# Altium schematic symbol library jlcpcb_2025_04_resistors_extended_0201.schlib: 1508 symbols (part 4 of 8) (continued)
## RC0201FR-072K1L (continued)

## RC0201FR-072K2L
designator R?  Resistance: 2.2kΩ  (hidden comment: *)
Resistor, 2.2kΩ, ±1%, 50mW, 25V, ±200ppm/℃, -55℃~+125℃, SMD 0201; Manufacturer: Uniroyal; Manufacturer Part Number: RC0201FR-072K2L; Supplier 1: LCSC; Supplier Part Number 1: C142018; JLCPCB Part Number: C142018; Power Rating: 50mW; Category: Resistors; Package Size: 0201; JLCPCB Basic Part: Yes; Tolerance: ±1%; Voltage Rating: 25V; Temperature Coefficient: ±200ppm/℃; Temperature Rating: -55℃~+125℃; ComponentLink1Description: Datasheet; ComponentLink1URL: https://wmsc.lcsc.com/wmsc/upload/file/pdf/v2/lcsc/2304140030_YAGEO-RC0201FR-072K2L_C142018.pdf; ComponentLink2Description: JLCPCB Part URL; ComponentLink2URL: https://jlcpcb.com/partdetail/C142018
pins: 1, 2
1 alternate drawing of the same symbol

## RC0201FR-072K05L
designator R?  Resistance: 2.05kΩ  (hidden comment: *)
Resistor, 2.05kΩ, ±1%, 50mW, 25V, ±200ppm/℃, -55℃~+125℃, SMD 0201; Manufacturer: Uniroyal; Manufacturer Part Number: RC0201FR-072K05L; Supplier 1: LCSC; Supplier Part Number 1: C474569; JLCPCB Part Number: C474569; Power Rating: 50mW; Category: Resistors; Package Size: 0201; JLCPCB Basic Part: Yes; Tolerance: ±1%; Voltage Rating: 25V; Temperature Coefficient: ±200ppm/℃; Temperature Rating: -55℃~+125℃; ComponentLink1Description: Datasheet; ComponentLink1URL: https://wmsc.lcsc.com/wmsc/upload/file/pdf/v2/lcsc/2311211101_YAGEO-RC0201FR-072K05L_C474569.pdf; ComponentLink2Description: JLCPCB Part URL; ComponentLink2URL: https://jlcpcb.com/partdetail/C474569
pins: 1, 2
1 alternate drawing of the same symbol

## RC0201FR-072K7L
designator R?  Resistance: 2.7kΩ  (hidden comment: *)
Resistor, 2.7kΩ, ±1%, 50mW, 25V, ±200ppm/℃, -55℃~+125℃, SMD 0201; Manufacturer: Uniroyal; Manufacturer Part Number: RC0201FR-072K7L; Supplier 1: LCSC; Supplier Part Number 1: C273271; JLCPCB Part Number: C273271; Power Rating: 50mW; Category: Resistors; Package Size: 0201; JLCPCB Basic Part: Yes; Tolerance: ±1%; Voltage Rating: 25V; Temperature Coefficient: ±200ppm/℃; Temperature Rating: -55℃~+125℃; ComponentLink1Description: Datasheet; ComponentLink1URL: https://wmsc.lcsc.com/wmsc/upload/file/pdf/v2/lcsc/2112231430_YAGEO-RC0201FR-072K7L_C273271.pdf; ComponentLink2Description: JLCPCB Part URL; ComponentLink2URL: https://jlcpcb.com/partdetail/C273271
pins: 1, 2
1 alternate drawing of the same symbol

## RC0201FR-072K21L
designator R?  Resistance: 2.21kΩ  (hidden comment: *)
Resistor, 2.21kΩ, ±1%, 50mW, 25V, ±200ppm/℃, -55℃~+125℃, SMD 0201; Manufacturer: Uniroyal; Manufacturer Part Number: RC0201FR-072K21L; Supplier 1: LCSC; Supplier Part Number 1: C273270; JLCPCB Part Number: C273270; Power Rating: 50mW; Category: Resistors; Package Size: 0201; JLCPCB Basic Part: Yes; Tolerance: ±1%; Voltage Rating: 25V; Temperature Coefficient: ±200ppm/℃; Temperature Rating: -55℃~+125℃; ComponentLink1Description: Datasheet; ComponentLink1URL: https://wmsc.lcsc.com/wmsc/upload/file/pdf/v2/lcsc/2202281730_YAGEO-RC0201FR-072K21L_C273270.pdf; ComponentLink2Description: JLCPCB Part URL; ComponentLink2URL: https://jlcpcb.com/partdetail/C273270
pins: 1, 2
1 alternate drawing of the same symbol

## RC0201FR-072K43L
designator R?  Resistance: 2.43kΩ  (hidden comment: *)
Resistor, 2.43kΩ, ±1%, 50mW, 25V, ±200ppm/℃, -55℃~+125℃, SMD 0201; Manufacturer: Uniroyal; Manufacturer Part Number: RC0201FR-072K43L; Supplier 1: LCSC; Supplier Part Number 1: C474578; JLCPCB Part Number: C474578; Power Rating: 50mW; Category: Resistors; Package Size: 0201; JLCPCB Basic Part: Yes; Tolerance: ±1%; Voltage Rating: 25V; Temperature Coefficient: ±200ppm/℃; Temperature Rating: -55℃~+125℃; ComponentLink1Description: Datasheet; ComponentLink1URL: https://wmsc.lcsc.com/wmsc/upload/file/pdf/v2/lcsc/2311211101_YAGEO-RC0201FR-072K43L_C474578.pdf; ComponentLink2Description: JLCPCB Part URL; ComponentLink2URL: https://jlcpcb.com/partdetail/C474578
pins: 1, 2
1 alternate drawing of the same symbol

## RC0201FR-072K49L
designator R?  Resistance: 2.49kΩ  (hidden comment: *)
Resistor, 2.49kΩ, ±1%, 50mW, 15V, ±200ppm/℃, -55℃~+125℃, SMD 0201; Manufacturer: Uniroyal; Manufacturer Part Number: RC0201FR-072K49L; Supplier 1: LCSC; Supplier Part Number 1: C273272; JLCPCB Part Number: C273272; Power Rating: 50mW; Category: Resistors; Package Size: 0201; JLCPCB Basic Part: Yes; Tolerance: ±1%; Voltage Rating: 15V; Temperature Coefficient: ±200ppm/℃; Temperature Rating: -55℃~+125℃; ComponentLink1Description: Datasheet; ComponentLink1URL: https://wmsc.lcsc.com/wmsc/upload/file/pdf/v2/lcsc/2201051730_YAGEO-RC0201FR-072K49L_C273272.pdf; ComponentLink2Description: JLCPCB Part URL; ComponentLink2URL: https://jlcpcb.com/partdetail/C273272
pins: 1, 2
1 alternate drawing of the same symbol

## RC0201FR-072K67L
designator R?  Resistance: 2.67kΩ  (hidden comment: *)
Resistor, 2.67kΩ, ±1%, 50mW, ±200ppm/℃, -55℃~+125℃, SMD 0201; Manufacturer: Uniroyal; Manufacturer Part Number: RC0201FR-072K67L; Supplier 1: LCSC; Supplier Part Number 1: C474588; JLCPCB Part Number: C474588; Power Rating: 50mW; Category: Resistors; Package Size: 0201; JLCPCB Basic Part: Yes; Tolerance: ±1%; Temperature Coefficient: ±200ppm/℃; Temperature Rating: -55℃~+125℃; ComponentLink1Description: Datasheet; ComponentLink1URL: https://wmsc.lcsc.com/wmsc/upload/file/pdf/v2/lcsc/2311211101_YAGEO-RC0201FR-072K67L_C474588.pdf; ComponentLink2Description: JLCPCB Part URL; ComponentLink2URL: https://jlcpcb.com/partdetail/C474588
pins: 1, 2
1 alternate drawing of the same symbol

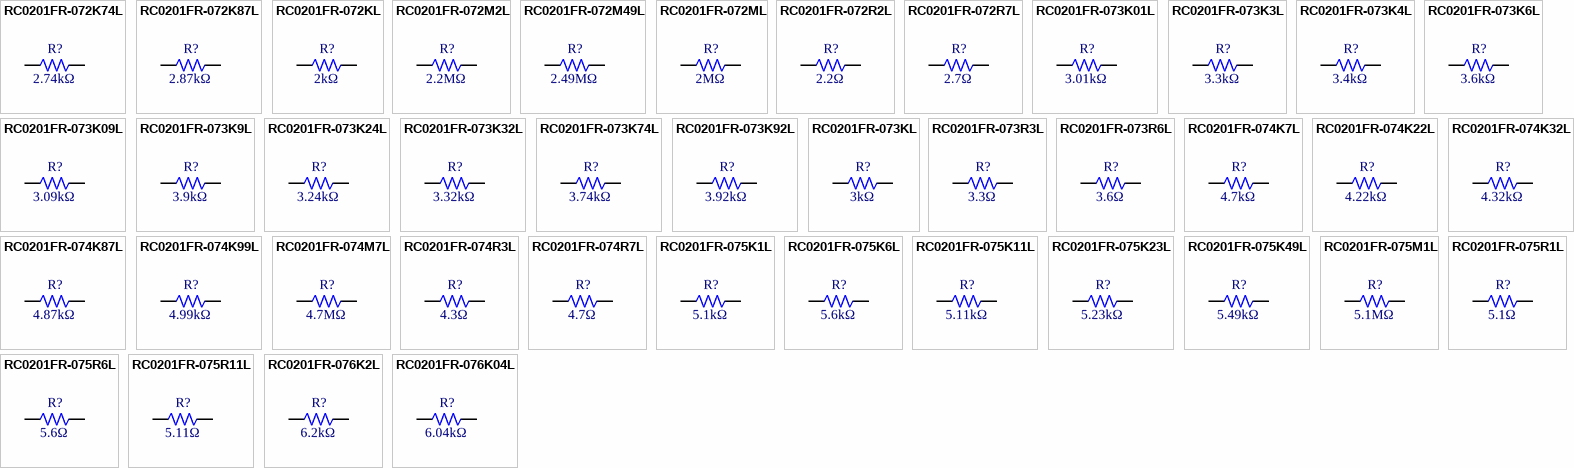
[diagram p16: symbols RC0201FR-072K74L to RC0201FR-076K04L]

## RC0201FR-072K74L
designator R?  Resistance: 2.74kΩ  (hidden comment: *)
Resistor, 2.74kΩ, ±1%, 50mW, ±200ppm/℃, -55℃~+125℃, SMD 0201; Manufacturer: Uniroyal; Manufacturer Part Number: RC0201FR-072K74L; Supplier 1: LCSC; Supplier Part Number 1: C474590; JLCPCB Part Number: C474590; Power Rating: 50mW; Category: Resistors; Package Size: 0201; JLCPCB Basic Part: Yes; Tolerance: ±1%; Temperature Coefficient: ±200ppm/℃; Temperature Rating: -55℃~+125℃; ComponentLink1Description: Datasheet; ComponentLink1URL: https://wmsc.lcsc.com/wmsc/upload/file/pdf/v2/lcsc/2311211101_YAGEO-RC0201FR-072K74L_C474590.pdf; ComponentLink2Description: JLCPCB Part URL; ComponentLink2URL: https://jlcpcb.com/partdetail/C474590
pins: 1, 2
1 alternate drawing of the same symbol

## RC0201FR-072K87L
designator R?  Resistance: 2.87kΩ  (hidden comment: *)
Resistor, 2.87kΩ, ±1%, 50mW, 25V, ±200ppm/℃, -55℃~+125℃, SMD 0201; Manufacturer: Uniroyal; Manufacturer Part Number: RC0201FR-072K87L; Supplier 1: LCSC; Supplier Part Number 1: C138155; JLCPCB Part Number: C138155; Power Rating: 50mW; Category: Resistors; Package Size: 0201; JLCPCB Basic Part: Yes; Tolerance: ±1%; Voltage Rating: 25V; Temperature Coefficient: ±200ppm/℃; Temperature Rating: -55℃~+125℃; ComponentLink1Description: Datasheet; ComponentLink1URL: https://wmsc.lcsc.com/wmsc/upload/file/pdf/v2/lcsc/2304140030_YAGEO-RC0201FR-072K87L_C138155.pdf; ComponentLink2Description: JLCPCB Part URL; ComponentLink2URL: https://jlcpcb.com/partdetail/C138155
pins: 1, 2
1 alternate drawing of the same symbol

## RC0201FR-072KL
designator R?  Resistance: 2kΩ  (hidden comment: *)
Resistor, 2kΩ, ±1%, 50mW, 25V, ±200ppm/℃, -55℃~+125℃, SMD 0201; Manufacturer: Uniroyal; Manufacturer Part Number: RC0201FR-072KL; Supplier 1: LCSC; Supplier Part Number 1: C327392; JLCPCB Part Number: C327392; Power Rating: 50mW; Category: Resistors; Package Size: 0201; JLCPCB Basic Part: Yes; Tolerance: ±1%; Voltage Rating: 25V; Temperature Coefficient: ±200ppm/℃; Temperature Rating: -55℃~+125℃; ComponentLink1Description: Datasheet; ComponentLink1URL: https://wmsc.lcsc.com/wmsc/upload/file/pdf/v2/lcsc/2304140030_YAGEO-RC0201FR-072KL_C327392.pdf; ComponentLink2Description: JLCPCB Part URL; ComponentLink2URL: https://jlcpcb.com/partdetail/C327392
pins: 1, 2
1 alternate drawing of the same symbol

## RC0201FR-072M2L
designator R?  Resistance: 2.2MΩ  (hidden comment: *)
Resistor, 2.2MΩ, ±1%, 50mW, 25V, ±200ppm/℃, -55℃~+125℃, SMD 0201; Manufacturer: Uniroyal; Manufacturer Part Number: RC0201FR-072M2L; Supplier 1: LCSC; Supplier Part Number 1: C474576; JLCPCB Part Number: C474576; Power Rating: 50mW; Category: Resistors; Package Size: 0201; JLCPCB Basic Part: Yes; Tolerance: ±1%; Voltage Rating: 25V; Temperature Coefficient: ±200ppm/℃; Temperature Rating: -55℃~+125℃; ComponentLink1Description: Datasheet; ComponentLink1URL: https://wmsc.lcsc.com/wmsc/upload/file/pdf/v2/lcsc/2311211101_YAGEO-RC0201FR-072M2L_C474576.pdf; ComponentLink2Description: JLCPCB Part URL; ComponentLink2URL: https://jlcpcb.com/partdetail/C474576
pins: 1, 2
1 alternate drawing of the same symbol

## RC0201FR-072M49L
designator R?  Resistance: 2.49MΩ  (hidden comment: *)
Resistor, 2.49MΩ, ±1%, 50mW, 25V, ±200ppm/℃, -55℃~+125℃, SMD 0201; Manufacturer: Uniroyal; Manufacturer Part Number: RC0201FR-072M49L; Supplier 1: LCSC; Supplier Part Number 1: C474579; JLCPCB Part Number: C474579; Power Rating: 50mW; Category: Resistors; Package Size: 0201; JLCPCB Basic Part: Yes; Tolerance: ±1%; Voltage Rating: 25V; Temperature Coefficient: ±200ppm/℃; Temperature Rating: -55℃~+125℃; ComponentLink1Description: Datasheet; ComponentLink1URL: https://wmsc.lcsc.com/wmsc/upload/file/pdf/v2/lcsc/2311211101_YAGEO-RC0201FR-072M49L_C474579.pdf; ComponentLink2Description: JLCPCB Part URL; ComponentLink2URL: https://jlcpcb.com/partdetail/C474579
pins: 1, 2
1 alternate drawing of the same symbol

## RC0201FR-072ML
designator R?  Resistance: 2MΩ  (hidden comment: *)
Resistor, 2MΩ, ±1%, 50mW, ±200ppm/℃, -55℃~+125℃, SMD 0201; Manufacturer: Uniroyal; Manufacturer Part Number: RC0201FR-072ML; Supplier 1: LCSC; Supplier Part Number 1: C474418; JLCPCB Part Number: C474418; Power Rating: 50mW; Category: Resistors; Package Size: 0201; JLCPCB Basic Part: Yes; Tolerance: ±1%; Temperature Coefficient: ±200ppm/℃; Temperature Rating: -55℃~+125℃; ComponentLink1Description: Datasheet; ComponentLink1URL: https://wmsc.lcsc.com/wmsc/upload/file/pdf/v2/lcsc/2311211101_YAGEO-RC0201FR-072ML_C474418.pdf; ComponentLink2Description: JLCPCB Part URL; ComponentLink2URL: https://jlcpcb.com/partdetail/C474418
pins: 1, 2
1 alternate drawing of the same symbol

## RC0201FR-072R2L
designator R?  Resistance: 2.2Ω  (hidden comment: *)
Resistor, 2.2Ω, ±1%, 50mW, 25V, -100ppm/℃~+350ppm/℃, -55℃~+125℃, SMD 0201; Manufacturer: Uniroyal; Manufacturer Part Number: RC0201FR-072R2L; Supplier 1: LCSC; Supplier Part Number 1: C138154; JLCPCB Part Number: C138154; Power Rating: 50mW; Category: Resistors; Package Size: 0201; JLCPCB Basic Part: Yes; Tolerance: ±1%; Voltage Rating: 25V; Temperature Coefficient: -100ppm/℃~+350ppm/℃; Temperature Rating: -55℃~+125℃; ComponentLink1Description: Datasheet; ComponentLink1URL: https://wmsc.lcsc.com/wmsc/upload/file/pdf/v2/lcsc/2304140030_YAGEO-RC0201FR-072R2L_C138154.pdf; ComponentLink2Description: JLCPCB Part URL; ComponentLink2URL: https://jlcpcb.com/partdetail/C138154
pins: 1, 2
1 alternate drawing of the same symbol

## RC0201FR-072R7L
designator R?  Resistance: 2.7Ω  (hidden comment: *)
Resistor, 2.7Ω, ±1%, 50mW, -100ppm/℃~+350ppm/℃, -55℃~+125℃, SMD 0201; Manufacturer: Uniroyal; Manufacturer Part Number: RC0201FR-072R7L; Supplier 1: LCSC; Supplier Part Number 1: C474594; JLCPCB Part Number: C474594; Power Rating: 50mW; Category: Resistors; Package Size: 0201; JLCPCB Basic Part: Yes; Tolerance: ±1%; Temperature Coefficient: -100ppm/℃~+350ppm/℃; Temperature Rating: -55℃~+125℃; ComponentLink1Description: Datasheet; ComponentLink1URL: https://wmsc.lcsc.com/wmsc/upload/file/pdf/v2/lcsc/2404151033_YAGEO-RC0201FR-072R7L_C474594.pdf; ComponentLink2Description: JLCPCB Part URL; ComponentLink2URL: https://jlcpcb.com/partdetail/C474594
pins: 1, 2
1 alternate drawing of the same symbol

## RC0201FR-073K01L
designator R?  Resistance: 3.01kΩ  (hidden comment: *)
Resistor, 3.01kΩ, ±1%, 50mW, 25V, ±200ppm/℃, -55℃~+125℃, SMD 0201; Manufacturer: Uniroyal; Manufacturer Part Number: RC0201FR-073K01L; Supplier 1: LCSC; Supplier Part Number 1: C474642; JLCPCB Part Number: C474642; Power Rating: 50mW; Category: Resistors; Package Size: 0201; JLCPCB Basic Part: Yes; Tolerance: ±1%; Voltage Rating: 25V; Temperature Coefficient: ±200ppm/℃; Temperature Rating: -55℃~+125℃; ComponentLink1Description: Datasheet; ComponentLink1URL: https://wmsc.lcsc.com/wmsc/upload/file/pdf/v2/lcsc/2311211101_YAGEO-RC0201FR-073K01L_C474642.pdf; ComponentLink2Description: JLCPCB Part URL; ComponentLink2URL: https://jlcpcb.com/partdetail/C474642
pins: 1, 2
1 alternate drawing of the same symbol

## RC0201FR-073K3L
designator R?  Resistance: 3.3kΩ  (hidden comment: *)
Resistor, 3.3kΩ, ±1%, 50mW, 25V, ±200ppm/℃, -55℃~+125℃, SMD 0201; Manufacturer: Uniroyal; Manufacturer Part Number: RC0201FR-073K3L; Supplier 1: LCSC; Supplier Part Number 1: C274874; JLCPCB Part Number: C274874; Power Rating: 50mW; Category: Resistors; Package Size: 0201; JLCPCB Basic Part: Yes; Tolerance: ±1%; Voltage Rating: 25V; Temperature Coefficient: ±200ppm/℃; Temperature Rating: -55℃~+125℃; ComponentLink1Description: Datasheet; ComponentLink1URL: https://wmsc.lcsc.com/wmsc/upload/file/pdf/v2/lcsc/2304140030_YAGEO-RC0201FR-073K3L_C274874.pdf; ComponentLink2Description: JLCPCB Part URL; ComponentLink2URL: https://jlcpcb.com/partdetail/C274874
pins: 1, 2
1 alternate drawing of the same symbol

## RC0201FR-073K4L
designator R?  Resistance: 3.4kΩ  (hidden comment: *)
Resistor, 3.4kΩ, ±1%, 50mW, 25V, ±200ppm/℃, -55℃~+125℃, SMD 0201; Manufacturer: Uniroyal; Manufacturer Part Number: RC0201FR-073K4L; Supplier 1: LCSC; Supplier Part Number 1: C138144; JLCPCB Part Number: C138144; Power Rating: 50mW; Category: Resistors; Package Size: 0201; JLCPCB Basic Part: Yes; Tolerance: ±1%; Voltage Rating: 25V; Temperature Coefficient: ±200ppm/℃; Temperature Rating: -55℃~+125℃; ComponentLink1Description: Datasheet; ComponentLink1URL: https://wmsc.lcsc.com/wmsc/upload/file/pdf/v2/lcsc/2304140030_YAGEO-RC0201FR-073K4L_C138144.pdf; ComponentLink2Description: JLCPCB Part URL; ComponentLink2URL: https://jlcpcb.com/partdetail/C138144
pins: 1, 2
1 alternate drawing of the same symbol

## RC0201FR-073K6L
designator R?  Resistance: 3.6kΩ  (hidden comment: *)
Resistor, 3.6kΩ, ±1%, 50mW, 25V, ±200ppm/℃, -55℃~+125℃, SMD 0201; Manufacturer: Uniroyal; Manufacturer Part Number: RC0201FR-073K6L; Supplier 1: LCSC; Supplier Part Number 1: C327389; JLCPCB Part Number: C327389; Power Rating: 50mW; Category: Resistors; Package Size: 0201; JLCPCB Basic Part: Yes; Tolerance: ±1%; Voltage Rating: 25V; Temperature Coefficient: ±200ppm/℃; Temperature Rating: -55℃~+125℃; ComponentLink1Description: Datasheet; ComponentLink1URL: https://wmsc.lcsc.com/wmsc/upload/file/pdf/v2/lcsc/1811141242_YAGEO-RC0201FR-073K6L_C327389.pdf; ComponentLink2Description: JLCPCB Part URL; ComponentLink2URL: https://jlcpcb.com/partdetail/C327389
pins: 1, 2
1 alternate drawing of the same symbol

## RC0201FR-073K09L
designator R?  Resistance: 3.09kΩ  (hidden comment: *)
Resistor, 3.09kΩ, ±1%, 50mW, ±200ppm/℃, -55℃~+125℃, SMD 0201; Manufacturer: Uniroyal; Manufacturer Part Number: RC0201FR-073K09L; Supplier 1: LCSC; Supplier Part Number 1: C474645; JLCPCB Part Number: C474645; Power Rating: 50mW; Category: Resistors; Package Size: 0201; JLCPCB Basic Part: Yes; Tolerance: ±1%; Temperature Coefficient: ±200ppm/℃; Temperature Rating: -55℃~+125℃; ComponentLink1Description: Datasheet; ComponentLink1URL: https://wmsc.lcsc.com/wmsc/upload/file/pdf/v2/lcsc/2311211101_YAGEO-RC0201FR-073K09L_C474645.pdf; ComponentLink2Description: JLCPCB Part URL; ComponentLink2URL: https://jlcpcb.com/partdetail/C474645
pins: 1, 2
1 alternate drawing of the same symbol

## RC0201FR-073K9L
designator R?  Resistance: 3.9kΩ  (hidden comment: *)
Resistor, 3.9kΩ, ±1%, 50mW, 25V, ±200ppm/℃, -55℃~+125℃, SMD 0201; Manufacturer: Uniroyal; Manufacturer Part Number: RC0201FR-073K9L; Supplier 1: LCSC; Supplier Part Number 1: C273280; JLCPCB Part Number: C273280; Power Rating: 50mW; Category: Resistors; Package Size: 0201; JLCPCB Basic Part: Yes; Tolerance: ±1%; Voltage Rating: 25V; Temperature Coefficient: ±200ppm/℃; Temperature Rating: -55℃~+125℃; ComponentLink1Description: Datasheet; ComponentLink1URL: https://wmsc.lcsc.com/wmsc/upload/file/pdf/v2/lcsc/2304140030_YAGEO-RC0201FR-073K9L_C273280.pdf; ComponentLink2Description: JLCPCB Part URL; ComponentLink2URL: https://jlcpcb.com/partdetail/C273280
pins: 1, 2
1 alternate drawing of the same symbol

## RC0201FR-073K24L
designator R?  Resistance: 3.24kΩ  (hidden comment: *)
Resistor, 3.24kΩ, ±1%, 50mW, ±200ppm/℃, -55℃~+125℃, SMD 0201; Manufacturer: Uniroyal; Manufacturer Part Number: RC0201FR-073K24L; Supplier 1: LCSC; Supplier Part Number 1: C474651; JLCPCB Part Number: C474651; Power Rating: 50mW; Category: Resistors; Package Size: 0201; JLCPCB Basic Part: Yes; Tolerance: ±1%; Temperature Coefficient: ±200ppm/℃; Temperature Rating: -55℃~+125℃; ComponentLink1Description: Datasheet; ComponentLink1URL: https://wmsc.lcsc.com/wmsc/upload/file/pdf/v2/lcsc/2311211101_YAGEO-RC0201FR-073K24L_C474651.pdf; ComponentLink2Description: JLCPCB Part URL; ComponentLink2URL: https://jlcpcb.com/partdetail/C474651
pins: 1, 2
1 alternate drawing of the same symbol

## RC0201FR-073K32L
designator R?  Resistance: 3.32kΩ  (hidden comment: *)
Resistor, 3.32kΩ, ±1%, 50mW, ±200ppm/℃, -55℃~+125℃, SMD 0201; Manufacturer: Uniroyal; Manufacturer Part Number: RC0201FR-073K32L; Supplier 1: LCSC; Supplier Part Number 1: C474652; JLCPCB Part Number: C474652; Power Rating: 50mW; Category: Resistors; Package Size: 0201; JLCPCB Basic Part: Yes; Tolerance: ±1%; Temperature Coefficient: ±200ppm/℃; Temperature Rating: -55℃~+125℃; ComponentLink1Description: Datasheet; ComponentLink1URL: https://wmsc.lcsc.com/wmsc/upload/file/pdf/v2/lcsc/2311211101_YAGEO-RC0201FR-073K32L_C474652.pdf; ComponentLink2Description: JLCPCB Part URL; ComponentLink2URL: https://jlcpcb.com/partdetail/C474652
pins: 1, 2
1 alternate drawing of the same symbol

## RC0201FR-073K74L
designator R?  Resistance: 3.74kΩ  (hidden comment: *)
Resistor, 3.74kΩ, ±1%, 50mW, ±200ppm/℃, -55℃~+125℃, SMD 0201; Manufacturer: Uniroyal; Manufacturer Part Number: RC0201FR-073K74L; Supplier 1: LCSC; Supplier Part Number 1: C273263; JLCPCB Part Number: C273263; Power Rating: 50mW; Category: Resistors; Package Size: 0201; JLCPCB Basic Part: Yes; Tolerance: ±1%; Temperature Coefficient: ±200ppm/℃; Temperature Rating: -55℃~+125℃; ComponentLink1Description: Datasheet; ComponentLink1URL: https://wmsc.lcsc.com/wmsc/upload/file/pdf/v2/lcsc/2206221715_YAGEO-RC0201FR-073K74L_C273263.pdf; ComponentLink2Description: JLCPCB Part URL; ComponentLink2URL: https://jlcpcb.com/partdetail/C273263
pins: 1, 2
1 alternate drawing of the same symbol

## RC0201FR-073K92L
designator R?  Resistance: 3.92kΩ  (hidden comment: *)
Resistor, 3.92kΩ, ±1%, 50mW, 25V, ±200ppm/℃, -55℃~+125℃, SMD 0201; Manufacturer: Uniroyal; Manufacturer Part Number: RC0201FR-073K92L; Supplier 1: LCSC; Supplier Part Number 1: C327388; JLCPCB Part Number: C327388; Power Rating: 50mW; Category: Resistors; Package Size: 0201; JLCPCB Basic Part: Yes; Tolerance: ±1%; Voltage Rating: 25V; Temperature Coefficient: ±200ppm/℃; Temperature Rating: -55℃~+125℃; ComponentLink1Description: Datasheet; ComponentLink1URL: https://wmsc.lcsc.com/wmsc/upload/file/pdf/v2/lcsc/1811011622_YAGEO-RC0201FR-073K92L_C327388.pdf; ComponentLink2Description: JLCPCB Part URL; ComponentLink2URL: https://jlcpcb.com/partdetail/C327388
pins: 1, 2
1 alternate drawing of the same symbol

## RC0201FR-073KL
designator R?  Resistance: 3kΩ  (hidden comment: *)
Resistor, 3kΩ, ±1%, 50mW, 25V, ±200ppm/℃, -55℃~+125℃, SMD 0201; Manufacturer: Uniroyal; Manufacturer Part Number: RC0201FR-073KL; Supplier 1: LCSC; Supplier Part Number 1: C142016; JLCPCB Part Number: C142016; Power Rating: 50mW; Category: Resistors; Package Size: 0201; JLCPCB Basic Part: Yes; Tolerance: ±1%; Voltage Rating: 25V; Temperature Coefficient: ±200ppm/℃; Temperature Rating: -55℃~+125℃; ComponentLink1Description: Datasheet; ComponentLink1URL: https://wmsc.lcsc.com/wmsc/upload/file/pdf/v2/lcsc/2304140030_YAGEO-RC0201FR-073KL_C142016.pdf; ComponentLink2Description: JLCPCB Part URL; ComponentLink2URL: https://jlcpcb.com/partdetail/C142016
pins: 1, 2
1 alternate drawing of the same symbol

## RC0201FR-073R3L
designator R?  Resistance: 3.3Ω  (hidden comment: *)
Resistor, 3.3Ω, ±1%, 50mW, 25V, -100ppm/℃~+350ppm/℃, -55℃~+125℃, SMD 0201; Manufacturer: Uniroyal; Manufacturer Part Number: RC0201FR-073R3L; Supplier 1: LCSC; Supplier Part Number 1: C474657; JLCPCB Part Number: C474657; Power Rating: 50mW; Category: Resistors; Package Size: 0201; JLCPCB Basic Part: Yes; Tolerance: ±1%; Voltage Rating: 25V; Temperature Coefficient: -100ppm/℃~+350ppm/℃; Temperature Rating: -55℃~+125℃; ComponentLink1Description: Datasheet; ComponentLink1URL: https://wmsc.lcsc.com/wmsc/upload/file/pdf/v2/lcsc/2311211101_YAGEO-RC0201FR-073R3L_C474657.pdf; ComponentLink2Description: JLCPCB Part URL; ComponentLink2URL: https://jlcpcb.com/partdetail/C474657
pins: 1, 2
1 alternate drawing of the same symbol

## RC0201FR-073R6L
designator R?  Resistance: 3.6Ω  (hidden comment: *)
Resistor, 3.6Ω, ±1%, 50mW, -100ppm/℃~+350ppm/℃, -55℃~+125℃, SMD 0201; Manufacturer: Uniroyal; Manufacturer Part Number: RC0201FR-073R6L; Supplier 1: LCSC; Supplier Part Number 1: C474663; JLCPCB Part Number: C474663; Power Rating: 50mW; Category: Resistors; Package Size: 0201; JLCPCB Basic Part: Yes; Tolerance: ±1%; Temperature Coefficient: -100ppm/℃~+350ppm/℃; Temperature Rating: -55℃~+125℃; ComponentLink1Description: Datasheet; ComponentLink1URL: https://wmsc.lcsc.com/wmsc/upload/file/pdf/v2/lcsc/2404151033_YAGEO-RC0201FR-073R6L_C474663.pdf; ComponentLink2Description: JLCPCB Part URL; ComponentLink2URL: https://jlcpcb.com/partdetail/C474663
pins: 1, 2
1 alternate drawing of the same symbol

## RC0201FR-074K7L
designator R?  Resistance: 4.7kΩ  (hidden comment: *)
Resistor, 4.7kΩ, ±1%, 50mW, 25V, ±200ppm/℃, -55℃~+125℃, SMD 0201; Manufacturer: Uniroyal; Manufacturer Part Number: RC0201FR-074K7L; Supplier 1: LCSC; Supplier Part Number 1: C138135; JLCPCB Part Number: C138135; Power Rating: 50mW; Category: Resistors; Package Size: 0201; JLCPCB Basic Part: Yes; Tolerance: ±1%; Voltage Rating: 25V; Temperature Coefficient: ±200ppm/℃; Temperature Rating: -55℃~+125℃; ComponentLink1Description: Datasheet; ComponentLink1URL: https://wmsc.lcsc.com/wmsc/upload/file/pdf/v2/lcsc/2304140030_YAGEO-RC0201FR-074K7L_C138135.pdf; ComponentLink2Description: JLCPCB Part URL; ComponentLink2URL: https://jlcpcb.com/partdetail/C138135
pins: 1, 2
1 alternate drawing of the same symbol

## RC0201FR-074K22L
designator R?  Resistance: 4.22kΩ  (hidden comment: *)
Resistor, 4.22kΩ, ±1%, 50mW, 25V, ±200ppm/℃, -55℃~+125℃, SMD 0201; Manufacturer: Uniroyal; Manufacturer Part Number: RC0201FR-074K22L; Supplier 1: LCSC; Supplier Part Number 1: C155739; JLCPCB Part Number: C155739; Power Rating: 50mW; Category: Resistors; Package Size: 0201; JLCPCB Basic Part: Yes; Tolerance: ±1%; Voltage Rating: 25V; Temperature Coefficient: ±200ppm/℃; Temperature Rating: -55℃~+125℃; ComponentLink1Description: Datasheet; ComponentLink1URL: https://wmsc.lcsc.com/wmsc/upload/file/pdf/v2/lcsc/2304140030_YAGEO-RC0201FR-074K22L_C155739.pdf; ComponentLink2Description: JLCPCB Part URL; ComponentLink2URL: https://jlcpcb.com/partdetail/C155739
pins: 1, 2
1 alternate drawing of the same symbol

## RC0201FR-074K32L
designator R?  Resistance: 4.32kΩ  (hidden comment: *)
Resistor, 4.32kΩ, ±1%, 50mW, ±200ppm/℃, -55℃~+125℃, SMD 0201; Manufacturer: Uniroyal; Manufacturer Part Number: RC0201FR-074K32L; Supplier 1: LCSC; Supplier Part Number 1: C474708; JLCPCB Part Number: C474708; Power Rating: 50mW; Category: Resistors; Package Size: 0201; JLCPCB Basic Part: Yes; Tolerance: ±1%; Temperature Coefficient: ±200ppm/℃; Temperature Rating: -55℃~+125℃; ComponentLink1Description: Datasheet; ComponentLink1URL: https://wmsc.lcsc.com/wmsc/upload/file/pdf/v2/lcsc/2311211101_YAGEO-RC0201FR-074K32L_C474708.pdf; ComponentLink2Description: JLCPCB Part URL; ComponentLink2URL: https://jlcpcb.com/partdetail/C474708
pins: 1, 2
1 alternate drawing of the same symbol

## RC0201FR-074K87L
designator R?  Resistance: 4.87kΩ  (hidden comment: *)
Resistor, 4.87kΩ, ±1%, 50mW, 25V, ±200ppm/℃, -55℃~+155℃, SMD 0201; Manufacturer: Uniroyal; Manufacturer Part Number: RC0201FR-074K87L; Supplier 1: LCSC; Supplier Part Number 1: C138134; JLCPCB Part Number: C138134; Power Rating: 50mW; Category: Resistors; Package Size: 0201; JLCPCB Basic Part: Yes; Tolerance: ±1%; Voltage Rating: 25V; Temperature Coefficient: ±200ppm/℃; Temperature Rating: -55℃~+155℃; ComponentLink1Description: Datasheet; ComponentLink1URL: https://wmsc.lcsc.com/wmsc/upload/file/pdf/v2/lcsc/2304140030_YAGEO-RC0201FR-074K87L_C138134.pdf; ComponentLink2Description: JLCPCB Part URL; ComponentLink2URL: https://jlcpcb.com/partdetail/C138134
pins: 1, 2
1 alternate drawing of the same symbol

## RC0201FR-074K99L
designator R?  Resistance: 4.99kΩ  (hidden comment: *)
Resistor, 4.99kΩ, ±1%, 50mW, 25V, ±200ppm/℃, -55℃~+125℃, SMD 0201; Manufacturer: Uniroyal; Manufacturer Part Number: RC0201FR-074K99L; Supplier 1: LCSC; Supplier Part Number 1: C273265; JLCPCB Part Number: C273265; Power Rating: 50mW; Category: Resistors; Package Size: 0201; JLCPCB Basic Part: Yes; Tolerance: ±1%; Voltage Rating: 25V; Temperature Coefficient: ±200ppm/℃; Temperature Rating: -55℃~+125℃; ComponentLink1Description: Datasheet; ComponentLink1URL: https://wmsc.lcsc.com/wmsc/upload/file/pdf/v2/lcsc/1912111437_YAGEO-RC0201FR-074K99L_C273265.pdf; ComponentLink2Description: JLCPCB Part URL; ComponentLink2URL: https://jlcpcb.com/partdetail/C273265
pins: 1, 2
1 alternate drawing of the same symbol

## RC0201FR-074M7L
designator R?  Resistance: 4.7MΩ  (hidden comment: *)
Resistor, 4.7MΩ, ±1%, 50mW, 25V, ±200ppm/℃, -55℃~+125℃, SMD 0201; Manufacturer: Uniroyal; Manufacturer Part Number: RC0201FR-074M7L; Supplier 1: LCSC; Supplier Part Number 1: C474424; JLCPCB Part Number: C474424; Power Rating: 50mW; Category: Resistors; Package Size: 0201; JLCPCB Basic Part: Yes; Tolerance: ±1%; Voltage Rating: 25V; Temperature Coefficient: ±200ppm/℃; Temperature Rating: -55℃~+125℃; ComponentLink1Description: Datasheet; ComponentLink1URL: https://wmsc.lcsc.com/wmsc/upload/file/pdf/v2/lcsc/2311211101_YAGEO-RC0201FR-074M7L_C474424.pdf; ComponentLink2Description: JLCPCB Part URL; ComponentLink2URL: https://jlcpcb.com/partdetail/C474424
pins: 1, 2
1 alternate drawing of the same symbol

## RC0201FR-074R3L
designator R?  Resistance: 4.3Ω  (hidden comment: *)
Resistor, 4.3Ω, ±1%, 50mW, -100ppm/℃~+350ppm/℃, -55℃~+125℃, SMD 0201; Manufacturer: Uniroyal; Manufacturer Part Number: RC0201FR-074R3L; Supplier 1: LCSC; Supplier Part Number 1: C474711; JLCPCB Part Number: C474711; Power Rating: 50mW; Category: Resistors; Package Size: 0201; JLCPCB Basic Part: Yes; Tolerance: ±1%; Temperature Coefficient: -100ppm/℃~+350ppm/℃; Temperature Rating: -55℃~+125℃; ComponentLink1Description: Datasheet; ComponentLink1URL: https://wmsc.lcsc.com/wmsc/upload/file/pdf/v2/lcsc/2311211101_YAGEO-RC0201FR-074R3L_C474711.pdf; ComponentLink2Description: JLCPCB Part URL; ComponentLink2URL: https://jlcpcb.com/partdetail/C474711
pins: 1, 2
1 alternate drawing of the same symbol

## RC0201FR-074R7L
designator R?  Resistance: 4.7Ω  (hidden comment: *)
Resistor, 4.7Ω, ±1%, 50mW, -100ppm/℃~+350ppm/℃, -55℃~+125℃, SMD 0201; Manufacturer: Uniroyal; Manufacturer Part Number: RC0201FR-074R7L; Supplier 1: LCSC; Supplier Part Number 1: C474426; JLCPCB Part Number: C474426; Power Rating: 50mW; Category: Resistors; Package Size: 0201; JLCPCB Basic Part: Yes; Tolerance: ±1%; Temperature Coefficient: -100ppm/℃~+350ppm/℃; Temperature Rating: -55℃~+125℃; ComponentLink1Description: Datasheet; ComponentLink1URL: https://wmsc.lcsc.com/wmsc/upload/file/pdf/v2/lcsc/2311211101_YAGEO-RC0201FR-074R7L_C474426.pdf; ComponentLink2Description: JLCPCB Part URL; ComponentLink2URL: https://jlcpcb.com/partdetail/C474426
pins: 1, 2
1 alternate drawing of the same symbol

## RC0201FR-075K1L
designator R?  Resistance: 5.1kΩ  (hidden comment: *)
Resistor, 5.1kΩ, ±1%, 50mW, 25V, ±200ppm/℃, -55℃~+125℃, SMD 0201; Manufacturer: Uniroyal; Manufacturer Part Number: RC0201FR-075K1L; Supplier 1: LCSC; Supplier Part Number 1: C274341; JLCPCB Part Number: C274341; Power Rating: 50mW; Category: Resistors; Package Size: 0201; JLCPCB Basic Part: Yes; Tolerance: ±1%; Voltage Rating: 25V; Temperature Coefficient: ±200ppm/℃; Temperature Rating: -55℃~+125℃; ComponentLink1Description: Datasheet; ComponentLink1URL: https://wmsc.lcsc.com/wmsc/upload/file/pdf/v2/lcsc/2304140030_YAGEO-RC0201FR-075K1L_C274341.pdf; ComponentLink2Description: JLCPCB Part URL; ComponentLink2URL: https://jlcpcb.com/partdetail/C274341
pins: 1, 2
1 alternate drawing of the same symbol

## RC0201FR-075K6L
designator R?  Resistance: 5.6kΩ  (hidden comment: *)
Resistor, 5.6kΩ, ±1%, 50mW, 25V, ±200ppm/℃, -55℃~+125℃, SMD 0201; Manufacturer: Uniroyal; Manufacturer Part Number: RC0201FR-075K6L; Supplier 1: LCSC; Supplier Part Number 1: C138132; JLCPCB Part Number: C138132; Power Rating: 50mW; Category: Resistors; Package Size: 0201; JLCPCB Basic Part: Yes; Tolerance: ±1%; Voltage Rating: 25V; Temperature Coefficient: ±200ppm/℃; Temperature Rating: -55℃~+125℃; ComponentLink1Description: Datasheet; ComponentLink1URL: https://wmsc.lcsc.com/wmsc/upload/file/pdf/v2/lcsc/2304140030_YAGEO-RC0201FR-075K6L_C138132.pdf; ComponentLink2Description: JLCPCB Part URL; ComponentLink2URL: https://jlcpcb.com/partdetail/C138132
pins: 1, 2
1 alternate drawing of the same symbol

## RC0201FR-075K11L
designator R?  Resistance: 5.11kΩ  (hidden comment: *)
Resistor, 5.11kΩ, ±1%, 50mW, ±200ppm/℃, -55℃~+125℃, SMD 0201; Manufacturer: Uniroyal; Manufacturer Part Number: RC0201FR-075K11L; Supplier 1: LCSC; Supplier Part Number 1: C474739; JLCPCB Part Number: C474739; Power Rating: 50mW; Category: Resistors; Package Size: 0201; JLCPCB Basic Part: Yes; Tolerance: ±1%; Temperature Coefficient: ±200ppm/℃; Temperature Rating: -55℃~+125℃; ComponentLink1Description: Datasheet; ComponentLink1URL: https://wmsc.lcsc.com/wmsc/upload/file/pdf/v2/lcsc/2311211101_YAGEO-RC0201FR-075K11L_C474739.pdf; ComponentLink2Description: JLCPCB Part URL; ComponentLink2URL: https://jlcpcb.com/partdetail/C474739
pins: 1, 2
1 alternate drawing of the same symbol

## RC0201FR-075K23L
designator R?  Resistance: 5.23kΩ  (hidden comment: *)
Resistor, 5.23kΩ, ±1%, 50mW, ±200ppm/℃, -55℃~+125℃, SMD 0201; Manufacturer: Uniroyal; Manufacturer Part Number: RC0201FR-075K23L; Supplier 1: LCSC; Supplier Part Number 1: C474742; JLCPCB Part Number: C474742; Power Rating: 50mW; Category: Resistors; Package Size: 0201; JLCPCB Basic Part: Yes; Tolerance: ±1%; Temperature Coefficient: ±200ppm/℃; Temperature Rating: -55℃~+125℃; ComponentLink1Description: Datasheet; ComponentLink1URL: https://wmsc.lcsc.com/wmsc/upload/file/pdf/v2/lcsc/2311211101_YAGEO-RC0201FR-075K23L_C474742.pdf; ComponentLink2Description: JLCPCB Part URL; ComponentLink2URL: https://jlcpcb.com/partdetail/C474742
pins: 1, 2
1 alternate drawing of the same symbol

## RC0201FR-075K49L
designator R?  Resistance: 5.49kΩ  (hidden comment: *)
Resistor, 5.49kΩ, ±1%, 50mW, ±200ppm/℃, -55℃~+125℃, SMD 0201; Manufacturer: Uniroyal; Manufacturer Part Number: RC0201FR-075K49L; Supplier 1: LCSC; Supplier Part Number 1: C474746; JLCPCB Part Number: C474746; Power Rating: 50mW; Category: Resistors; Package Size: 0201; JLCPCB Basic Part: Yes; Tolerance: ±1%; Temperature Coefficient: ±200ppm/℃; Temperature Rating: -55℃~+125℃; ComponentLink1Description: Datasheet; ComponentLink1URL: https://wmsc.lcsc.com/wmsc/upload/file/pdf/v2/lcsc/2311211101_YAGEO-RC0201FR-075K49L_C474746.pdf; ComponentLink2Description: JLCPCB Part URL; ComponentLink2URL: https://jlcpcb.com/partdetail/C474746
pins: 1, 2
1 alternate drawing of the same symbol

## RC0201FR-075M1L
designator R?  Resistance: 5.1MΩ  (hidden comment: *)
Resistor, 5.1MΩ, ±1%, 50mW, ±200ppm/℃, -55℃~+125℃, SMD 0201; Manufacturer: Uniroyal; Manufacturer Part Number: RC0201FR-075M1L; Supplier 1: LCSC; Supplier Part Number 1: C474428; JLCPCB Part Number: C474428; Power Rating: 50mW; Category: Resistors; Package Size: 0201; JLCPCB Basic Part: Yes; Tolerance: ±1%; Temperature Coefficient: ±200ppm/℃; Temperature Rating: -55℃~+125℃; ComponentLink1Description: Datasheet; ComponentLink1URL: https://wmsc.lcsc.com/wmsc/upload/file/pdf/v2/lcsc/2311211101_YAGEO-RC0201FR-075M1L_C474428.pdf; ComponentLink2Description: JLCPCB Part URL; ComponentLink2URL: https://jlcpcb.com/partdetail/C474428
pins: 1, 2
1 alternate drawing of the same symbol

## RC0201FR-075R1L
designator R?  Resistance: 5.1Ω  (hidden comment: *)
Resistor, 5.1Ω, ±1%, 50mW, 25V, -100ppm/℃~+350ppm/℃, -55℃~+125℃, SMD 0201; Manufacturer: Uniroyal; Manufacturer Part Number: RC0201FR-075R1L; Supplier 1: LCSC; Supplier Part Number 1: C309537; JLCPCB Part Number: C309537; Power Rating: 50mW; Category: Resistors; Package Size: 0201; JLCPCB Basic Part: Yes; Tolerance: ±1%; Voltage Rating: 25V; Temperature Coefficient: -100ppm/℃~+350ppm/℃; Temperature Rating: -55℃~+125℃; ComponentLink1Description: Datasheet; ComponentLink1URL: https://wmsc.lcsc.com/wmsc/upload/file/pdf/v2/lcsc/2304140030_YAGEO-RC0201FR-075R1L_C309537.pdf; ComponentLink2Description: JLCPCB Part URL; ComponentLink2URL: https://jlcpcb.com/partdetail/C309537
pins: 1, 2
1 alternate drawing of the same symbol

## RC0201FR-075R6L
designator R?  Resistance: 5.6Ω  (hidden comment: *)
Resistor, 5.6Ω, ±1%, 50mW, 25V, -100ppm/℃~+350ppm/℃, -55℃~+125℃, SMD 0201; Manufacturer: Uniroyal; Manufacturer Part Number: RC0201FR-075R6L; Supplier 1: LCSC; Supplier Part Number 1: C155465; JLCPCB Part Number: C155465; Power Rating: 50mW; Category: Resistors; Package Size: 0201; JLCPCB Basic Part: Yes; Tolerance: ±1%; Voltage Rating: 25V; Temperature Coefficient: -100ppm/℃~+350ppm/℃; Temperature Rating: -55℃~+125℃; ComponentLink1Description: Datasheet; ComponentLink1URL: https://wmsc.lcsc.com/wmsc/upload/file/pdf/v2/lcsc/2304140030_YAGEO-RC0201FR-075R6L_C155465.pdf; ComponentLink2Description: JLCPCB Part URL; ComponentLink2URL: https://jlcpcb.com/partdetail/C155465
pins: 1, 2
1 alternate drawing of the same symbol

## RC0201FR-075R11L
designator R?  Resistance: 5.11Ω  (hidden comment: *)
Resistor, 5.11Ω, ±1%, 50mW, -100ppm/℃~+350ppm/℃, -55℃~+125℃, SMD 0201; Manufacturer: Uniroyal; Manufacturer Part Number: RC0201FR-075R11L; Supplier 1: LCSC; Supplier Part Number 1: C474741; JLCPCB Part Number: C474741; Power Rating: 50mW; Category: Resistors; Package Size: 0201; JLCPCB Basic Part: Yes; Tolerance: ±1%; Temperature Coefficient: -100ppm/℃~+350ppm/℃; Temperature Rating: -55℃~+125℃; ComponentLink1Description: Datasheet; ComponentLink1URL: https://wmsc.lcsc.com/wmsc/upload/file/pdf/v2/lcsc/2404151033_YAGEO-RC0201FR-075R11L_C474741.pdf; ComponentLink2Description: JLCPCB Part URL; ComponentLink2URL: https://jlcpcb.com/partdetail/C474741
pins: 1, 2
1 alternate drawing of the same symbol

## RC0201FR-076K2L
designator R?  Resistance: 6.2kΩ  (hidden comment: *)
Resistor, 6.2kΩ, ±1%, 50mW, 25V, ±200ppm/℃, -55℃~+125℃, SMD 0201; Manufacturer: Uniroyal; Manufacturer Part Number: RC0201FR-076K2L; Supplier 1: LCSC; Supplier Part Number 1: C295814; JLCPCB Part Number: C295814; Power Rating: 50mW; Category: Resistors; Package Size: 0201; JLCPCB Basic Part: Yes; Tolerance: ±1%; Voltage Rating: 25V; Temperature Coefficient: ±200ppm/℃; Temperature Rating: -55℃~+125℃; ComponentLink1Description: Datasheet; ComponentLink1URL: https://wmsc.lcsc.com/wmsc/upload/file/pdf/v2/lcsc/2304140030_YAGEO-RC0201FR-076K2L_C295814.pdf; ComponentLink2Description: JLCPCB Part URL; ComponentLink2URL: https://jlcpcb.com/partdetail/C295814
pins: 1, 2
1 alternate drawing of the same symbol

## RC0201FR-076K04L
designator R?  Resistance: 6.04kΩ  (hidden comment: *)
Resistor, 6.04kΩ, ±1%, 50mW, 25V, ±200ppm/℃, -55℃~+125℃, SMD 0201; Manufacturer: Uniroyal; Manufacturer Part Number: RC0201FR-076K04L; Supplier 1: LCSC; Supplier Part Number 1: C364363; JLCPCB Part Number: C364363; Power Rating: 50mW; Category: Resistors; Package Size: 0201; JLCPCB Basic Part: Yes; Tolerance: ±1%; Voltage Rating: 25V; Temperature Coefficient: ±200ppm/℃; Temperature Rating: -55℃~+125℃; ComponentLink1Description: Datasheet; ComponentLink1URL: https://wmsc.lcsc.com/wmsc/upload/file/pdf/v2/lcsc/1912111437_YAGEO-RC0201FR-076K04L_C364363.pdf; ComponentLink2Description: JLCPCB Part URL; ComponentLink2URL: https://jlcpcb.com/partdetail/C364363
pins: 1, 2
1 alternate drawing of the same symbol
